# Altium schematic symbol library TI Logic Gate.SchLib: 2017 symbols (part 8 of 36) (continued)
## CD4081BPWR (continued)
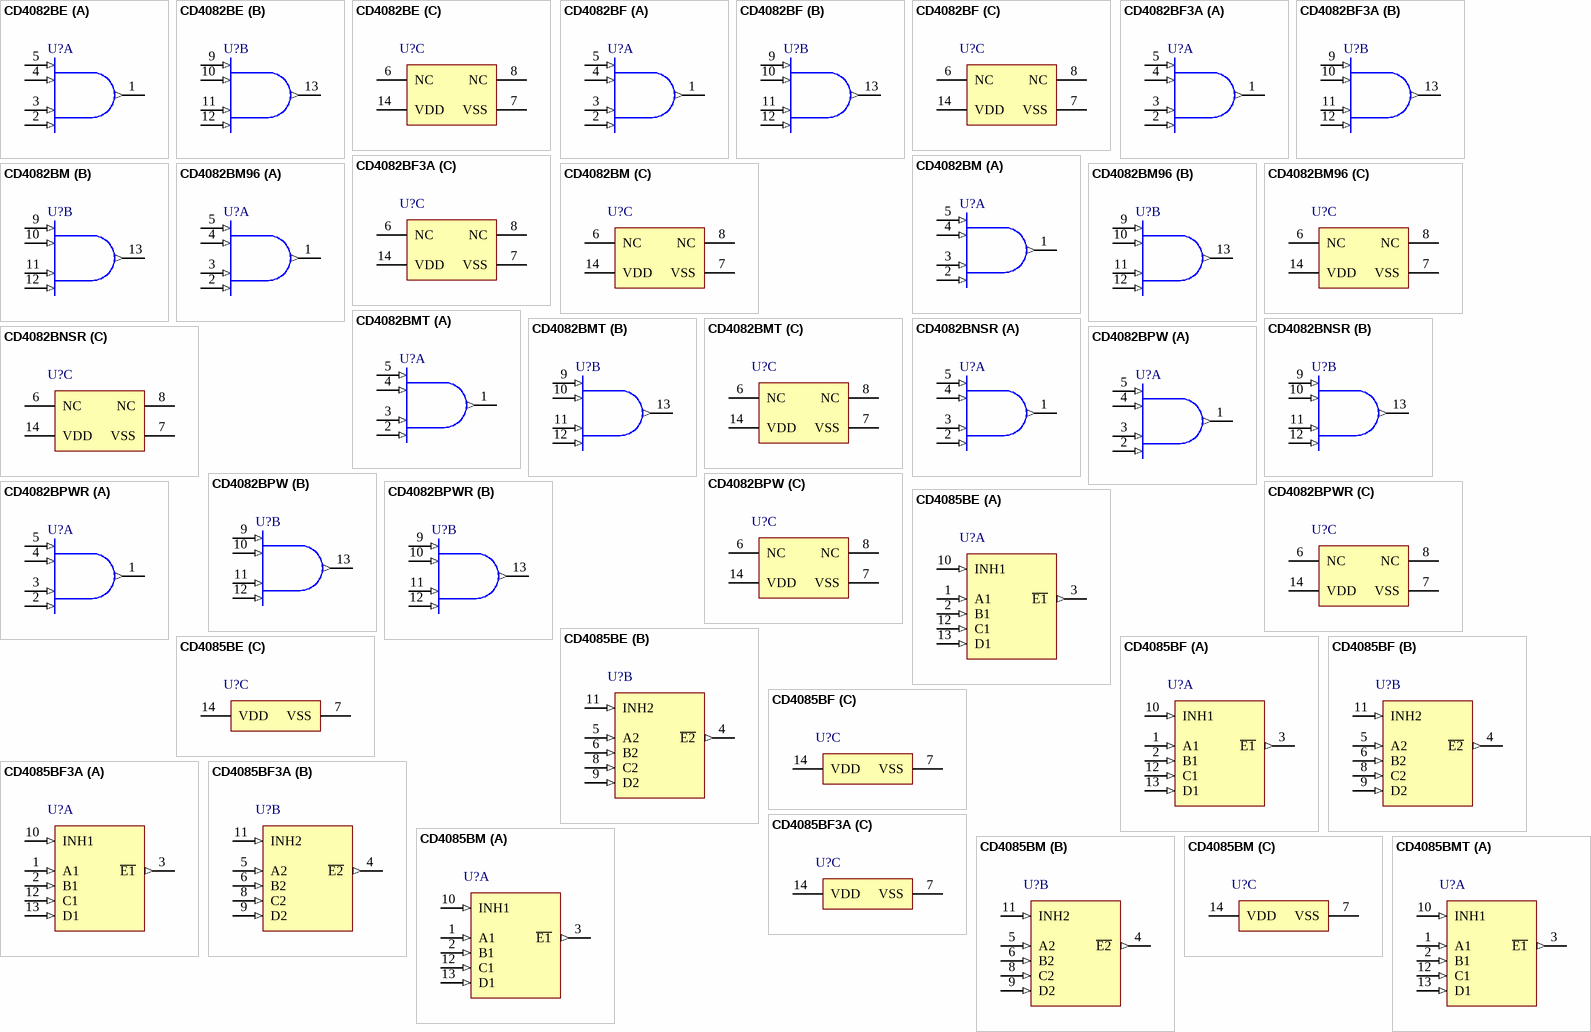
[diagram p47: symbols CD4082BE to CD4085BMT]

## CD4082BE
designator U?
CMOS Dual 4-Input AND Gate, N0014A, TUBE; Generic Part Number: CD4082B; Manufacturer: Texas Instruments; PartNumber: CD4082BE; VCC(Max)(V): 18; VCC(Min)(V): 3; ICC @ Nom Voltage(Max)(mA): 0.015; Bits(#): 2; F @ Nom Voltage(Max)(Mhz): 8; Rating: Catalog; Technology Family: CD4000; Voltage(Nom)(V): 10; Schmitt Trigger: No; Output Drive (IOL/IOH)(Max)(mA): -6.8/6.8; tpd @ Nom Voltage(Max)(ns): 120; DatasheetVersion: SCHS057C; PackageReference: N0014A; Supplier 1: Mouser; Supplier Part Number 1: 595-CD4082BE; Supplier 2: Digi-Key; Supplier Part Number 2: 296-2067-5-ND; Output Type: CMOS; Input Type: CMOS; Operating Temperature Range(C): -55 to 125; ComponentLink1Description: Manufacturer URL; ComponentLink1URL: http://www.ti.com/; ComponentLink2Description: Datasheet; ComponentLink2URL: http://www.ti.com/lit/ds/symlink/cd4082b.pdf
footprint N0014A (DIP, 14-Leads, Body 19.7x6.6mm, Pitch 2.54mm)
part A pins: 1 J (out), 2 D (in), 3 C (in), 4 B (in), 5 A (in)
part B pins: 9 E (in), 10 F (in), 11 G (in), 12 H (in), 13 K (out)
part C pins: 6 NC, 7 VSS (power), 8 NC, 14 VDD (power)

## CD4082BF
designator U?
CMOS Dual 4-Input AND Gate, J0014A, TUBE; Generic Part Number: CD4082B-MIL; Manufacturer: Texas Instruments; PartNumber: CD4082BF; VCC(Max)(V): 18; VCC(Min)(V): 3; ICC @ Nom Voltage(Max)(mA): 0.015; Bits(#): 2; F @ Nom Voltage(Max)(Mhz): 8; Rating: Military; Technology Family: CD4000; Voltage(Nom)(V): 10; Schmitt Trigger: No; Output Drive (IOL/IOH)(Max)(mA): -1.5/1.5; tpd @ Nom Voltage(Max)(ns): 250; DatasheetVersion: SCHS057C; PackageReference: J0014A; Output Type: CMOS; Input Type: CMOS; Operating Temperature Range(C): -55 to 125; ComponentLink1Description: Manufacturer URL; ComponentLink1URL: http://www.ti.com/; ComponentLink2Description: Datasheet; ComponentLink2URL: http://www.ti.com/lit/ds/symlink/cd4082b-mil.pdf
footprint J0014A (DIP, 14-Leads, Body 19.95x7.2mm, Pitch 2.54mm)
part A pins: 1 J (out), 2 D (in), 3 C (in), 4 B (in), 5 A (in)
part B pins: 9 E (in), 10 F (in), 11 G (in), 12 H (in), 13 K (out)
part C pins: 6 NC, 7 VSS (power), 8 NC, 14 VDD (power)

## CD4082BF3A
designator U?
CMOS Dual 4-Input AND Gate, J0014A, TUBE; Generic Part Number: CD4082B-MIL; Manufacturer: Texas Instruments; PartNumber: CD4082BF3A; VCC(Max)(V): 18; VCC(Min)(V): 3; ICC @ Nom Voltage(Max)(mA): 0.015; Bits(#): 2; F @ Nom Voltage(Max)(Mhz): 8; Rating: Military; Technology Family: CD4000; Voltage(Nom)(V): 10; Schmitt Trigger: No; Output Drive (IOL/IOH)(Max)(mA): -1.5/1.5; tpd @ Nom Voltage(Max)(ns): 250; DatasheetVersion: SCHS057C; PackageReference: J0014A; Output Type: CMOS; Input Type: CMOS; Operating Temperature Range(C): -55 to 125; ComponentLink1Description: Manufacturer URL; ComponentLink1URL: http://www.ti.com/; ComponentLink2Description: Datasheet; ComponentLink2URL: http://www.ti.com/lit/ds/symlink/cd4082b-mil.pdf
footprint J0014A (DIP, 14-Leads, Body 19.95x7.2mm, Pitch 2.54mm)
part A pins: 1 J (out), 2 D (in), 3 C (in), 4 B (in), 5 A (in)
part B pins: 9 E (in), 10 F (in), 11 G (in), 12 H (in), 13 K (out)
part C pins: 6 NC, 7 VSS (power), 8 NC, 14 VDD (power)

## CD4082BM
designator U?
CMOS Dual 4-Input AND Gate, D0014A, TUBE; Generic Part Number: CD4082B; Manufacturer: Texas Instruments; PartNumber: CD4082BM; VCC(Max)(V): 18; VCC(Min)(V): 3; ICC @ Nom Voltage(Max)(mA): 0.015; Bits(#): 2; F @ Nom Voltage(Max)(Mhz): 8; Rating: Catalog; Technology Family: CD4000; Voltage(Nom)(V): 10; Schmitt Trigger: No; Output Drive (IOL/IOH)(Max)(mA): -6.8/6.8; tpd @ Nom Voltage(Max)(ns): 120; DatasheetVersion: SCHS057C; PackageReference: D0014A; Supplier 1: Mouser; Supplier Part Number 1: 595-CD4082BM; Supplier 2: Digi-Key; Supplier Part Number 2: 296-32913-5-ND; Output Type: CMOS; Input Type: CMOS; Operating Temperature Range(C): -55 to 125; ComponentLink1Description: Manufacturer URL; ComponentLink1URL: http://www.ti.com/; ComponentLink2Description: Datasheet; ComponentLink2URL: http://www.ti.com/lit/ds/symlink/cd4082b.pdf
footprint D0014A_N (SOIC, 14-Leads, Body 8.75x4mm, Pitch 1.27mm, IPC Medium Density)
footprint D0014A_M (SOIC, 14-Leads, Body 8.75x4mm, Pitch 1.27mm, IPC Low Density)
footprint D0014A_L (SOIC, 14-Leads, Body 8.75x4mm, Pitch 1.27mm, IPC High Density)
part A pins: 1 J (out), 2 D (in), 3 C (in), 4 B (in), 5 A (in)
part B pins: 9 E (in), 10 F (in), 11 G (in), 12 H (in), 13 K (out)
part C pins: 6 NC, 7 VSS (power), 8 NC, 14 VDD (power)

## CD4082BM96
designator U?
CMOS Dual 4-Input AND Gate, D0014A, LARGE T&R; Generic Part Number: CD4082B; Manufacturer: Texas Instruments; PartNumber: CD4082BM96; VCC(Max)(V): 18; VCC(Min)(V): 3; ICC @ Nom Voltage(Max)(mA): 0.015; Bits(#): 2; F @ Nom Voltage(Max)(Mhz): 8; Rating: Catalog; Technology Family: CD4000; Voltage(Nom)(V): 10; Schmitt Trigger: No; Output Drive (IOL/IOH)(Max)(mA): -6.8/6.8; tpd @ Nom Voltage(Max)(ns): 120; DatasheetVersion: SCHS057C; PackageReference: D0014A; Supplier 1: Mouser; Supplier Part Number 1: 595-CD4082BM96; Supplier 2: Digi-Key; Supplier Part Number 2: 296-31523-2-ND; Supplier 3: Digi-Key; Supplier Part Number 3: 296-31523-1-ND; Supplier 4: Digi-Key; Supplier Part Number 4: 296-31523-6-ND; Output Type: CMOS; Input Type: CMOS; Operating Temperature Range(C): -55 to 125; ComponentLink1Description: Manufacturer URL; ComponentLink1URL: http://www.ti.com/; ComponentLink2Description: Datasheet; ComponentLink2URL: http://www.ti.com/lit/ds/symlink/cd4082b.pdf
footprint D0014A_N (SOIC, 14-Leads, Body 8.75x4mm, Pitch 1.27mm, IPC Medium Density)
footprint D0014A_M (SOIC, 14-Leads, Body 8.75x4mm, Pitch 1.27mm, IPC Low Density)
footprint D0014A_L (SOIC, 14-Leads, Body 8.75x4mm, Pitch 1.27mm, IPC High Density)
part A pins: 1 J (out), 2 D (in), 3 C (in), 4 B (in), 5 A (in)
part B pins: 9 E (in), 10 F (in), 11 G (in), 12 H (in), 13 K (out)
part C pins: 6 NC, 7 VSS (power), 8 NC, 14 VDD (power)

## CD4082BMT
designator U?
CMOS Dual 4-Input AND Gate, D0014A, SMALL T&R; Generic Part Number: CD4082B; Manufacturer: Texas Instruments; PartNumber: CD4082BMT; VCC(Max)(V): 18; VCC(Min)(V): 3; ICC @ Nom Voltage(Max)(mA): 0.015; Bits(#): 2; F @ Nom Voltage(Max)(Mhz): 8; Rating: Catalog; Technology Family: CD4000; Voltage(Nom)(V): 10; Schmitt Trigger: No; Output Drive (IOL/IOH)(Max)(mA): -6.8/6.8; tpd @ Nom Voltage(Max)(ns): 120; DatasheetVersion: SCHS057C; PackageReference: D0014A; Supplier 1: Mouser; Supplier Part Number 1: 595-CD4082BMT; Supplier 2: Digi-Key; Supplier Part Number 2: CD4082BMT-ND; Output Type: CMOS; Input Type: CMOS; Operating Temperature Range(C): -55 to 125; ComponentLink1Description: Manufacturer URL; ComponentLink1URL: http://www.ti.com/; ComponentLink2Description: Datasheet; ComponentLink2URL: http://www.ti.com/lit/ds/symlink/cd4082b.pdf
footprint D0014A_N (SOIC, 14-Leads, Body 8.75x4mm, Pitch 1.27mm, IPC Medium Density)
footprint D0014A_M (SOIC, 14-Leads, Body 8.75x4mm, Pitch 1.27mm, IPC Low Density)
footprint D0014A_L (SOIC, 14-Leads, Body 8.75x4mm, Pitch 1.27mm, IPC High Density)
part A pins: 1 J (out), 2 D (in), 3 C (in), 4 B (in), 5 A (in)
part B pins: 9 E (in), 10 F (in), 11 G (in), 12 H (in), 13 K (out)
part C pins: 6 NC, 7 VSS (power), 8 NC, 14 VDD (power)

## CD4082BNSR
designator U?
CMOS Dual 4-Input AND Gate, NS0014A, LARGE T&R; Generic Part Number: CD4082B; Manufacturer: Texas Instruments; PartNumber: CD4082BNSR; VCC(Max)(V): 18; VCC(Min)(V): 3; ICC @ Nom Voltage(Max)(mA): 0.015; Bits(#): 2; F @ Nom Voltage(Max)(Mhz): 8; Rating: Catalog; Technology Family: CD4000; Voltage(Nom)(V): 10; Schmitt Trigger: No; Output Drive (IOL/IOH)(Max)(mA): -6.8/6.8; tpd @ Nom Voltage(Max)(ns): 120; DatasheetVersion: SCHS057C; PackageReference: NS0014A; Supplier 1: Mouser; Supplier Part Number 1: 595-CD4082BNSR; Supplier 2: Digi-Key; Supplier Part Number 2: 296-31524-2-ND; Supplier 3: Digi-Key; Supplier Part Number 3: 296-31524-1-ND; Supplier 4: Digi-Key; Supplier Part Number 4: 296-31524-6-ND; Output Type: CMOS; Input Type: CMOS; Operating Temperature Range(C): -55 to 125; ComponentLink1Description: Manufacturer URL; ComponentLink1URL: http://www.ti.com/; ComponentLink2Description: Datasheet; ComponentLink2URL: http://www.ti.com/lit/ds/symlink/cd4082b.pdf
footprint NS0014A_N (SOIC,14-Leads,Body 10.5x5.6mm,Pitch 1.27mm,IPC Medium Density)
footprint NS0014A_M (SOIC,14-Leads,Body 10.5x5.6mm,Pitch 1.27mm,IPC Low Density)
footprint NS0014A_L (SOIC,14-Leads,Body 10.5x5.6mm,Pitch 0.4mm,IPC High Density)
part A pins: 1 J (out), 2 D (in), 3 C (in), 4 B (in), 5 A (in)
part B pins: 9 E (in), 10 F (in), 11 G (in), 12 H (in), 13 K (out)
part C pins: 6 NC, 7 VSS (power), 8 NC, 14 VDD (power)

## CD4082BPW
designator U?
CMOS Dual 4-Input AND Gate, PW0014A, TUBE; Generic Part Number: CD4082B; Manufacturer: Texas Instruments; PartNumber: CD4082BPW; VCC(Max)(V): 18; VCC(Min)(V): 3; ICC @ Nom Voltage(Max)(mA): 0.015; Bits(#): 2; F @ Nom Voltage(Max)(Mhz): 8; Rating: Catalog; Technology Family: CD4000; Voltage(Nom)(V): 10; Schmitt Trigger: No; Output Drive (IOL/IOH)(Max)(mA): -6.8/6.8; tpd @ Nom Voltage(Max)(ns): 120; DatasheetVersion: SCHS057C; PackageReference: PW0014A; Supplier 1: Mouser; Supplier Part Number 1: 595-CD4082BPW; Supplier 2: Digi-Key; Supplier Part Number 2: 296-32914-5-ND; Output Type: CMOS; Input Type: CMOS; Operating Temperature Range(C): -55 to 125; ComponentLink1Description: Manufacturer URL; ComponentLink1URL: http://www.ti.com/; ComponentLink2Description: Datasheet; ComponentLink2URL: http://www.ti.com/lit/ds/symlink/cd4082b.pdf
footprint PW0014A_N (SOP, 14-Leads, Body 5.1x4.5mm, Pitch 0.65mm, IPC Medium Density)
footprint PW0014A_M (SOP, 14-Leads, Body 5.1x4.5mm, Pitch 0.65mm, IPC Low Density)
footprint PW0014A_L (SOP, 14-Leads, Body 5.1x4.5mm, Pitch 0.65mm, IPC High Density)
part A pins: 1 J (out), 2 D (in), 3 C (in), 4 B (in), 5 A (in)
part B pins: 9 E (in), 10 F (in), 11 G (in), 12 H (in), 13 K (out)
part C pins: 6 NC, 7 VSS (power), 8 NC, 14 VDD (power)

## CD4082BPWR
designator U?
CMOS Dual 4-Input AND Gate, PW0014A, LARGE T&R; Generic Part Number: CD4082B; Manufacturer: Texas Instruments; PartNumber: CD4082BPWR; VCC(Max)(V): 18; VCC(Min)(V): 3; ICC @ Nom Voltage(Max)(mA): 0.015; Bits(#): 2; F @ Nom Voltage(Max)(Mhz): 8; Rating: Catalog; Technology Family: CD4000; Voltage(Nom)(V): 10; Schmitt Trigger: No; Output Drive (IOL/IOH)(Max)(mA): -6.8/6.8; tpd @ Nom Voltage(Max)(ns): 120; DatasheetVersion: SCHS057C; PackageReference: PW0014A; Supplier 1: Mouser; Supplier Part Number 1: 595-CD4082BPWR; Supplier 2: Digi-Key; Supplier Part Number 2: 296-31525-2-ND; Supplier 3: Digi-Key; Supplier Part Number 3: 296-31525-1-ND; Supplier 4: Digi-Key; Supplier Part Number 4: 296-31525-6-ND; Output Type: CMOS; Input Type: CMOS; Operating Temperature Range(C): -55 to 125; ComponentLink1Description: Manufacturer URL; ComponentLink1URL: http://www.ti.com/; ComponentLink2Description: Datasheet; ComponentLink2URL: http://www.ti.com/lit/ds/symlink/cd4082b.pdf
footprint PW0014A_N (SOP, 14-Leads, Body 5.1x4.5mm, Pitch 0.65mm, IPC Medium Density)
footprint PW0014A_M (SOP, 14-Leads, Body 5.1x4.5mm, Pitch 0.65mm, IPC Low Density)
footprint PW0014A_L (SOP, 14-Leads, Body 5.1x4.5mm, Pitch 0.65mm, IPC High Density)
part A pins: 1 J (out), 2 D (in), 3 C (in), 4 B (in), 5 A (in)
part B pins: 9 E (in), 10 F (in), 11 G (in), 12 H (in), 13 K (out)
part C pins: 6 NC, 7 VSS (power), 8 NC, 14 VDD (power)

## CD4085BE
designator U?
CMOS Dual 2-Wide 2-Input AND-OR-INVERT Gate, N0014A, TUBE; Generic Part Number: CD4085B; Manufacturer: Texas Instruments; PartNumber: CD4085BE; VCC(Max)(V): 18; VCC(Min)(V): 3; ICC @ Nom Voltage(Max)(mA): 0.06; Bits(#): 2; F @ Nom Voltage(Max)(Mhz): 8; Rating: Catalog; Technology Family: CD4000; Voltage(Nom)(V): 10; Schmitt Trigger: No; Output Drive (IOL/IOH)(Max)(mA): 1.5/-1.5; tpd @ Nom Voltage(Max)(ns): 250; DatasheetVersion: SCHS060C; PackageReference: N0014A; Supplier 1: Mouser; Supplier Part Number 1: 595-CD4085BE; Supplier 2: Digi-Key; Supplier Part Number 2: 296-3522-5-ND; Output Type: CMOS; Input Type: CMOS; Operating Temperature Range(C): -55 to 125; Code_JEDEC: MS-001; ComponentLink1Description: Manufacturer URL; ComponentLink1URL: http://www.ti.com/; ComponentLink2Description: Datasheet; ComponentLink2URL: http://www.ti.com/lit/ds/symlink/cd4085b.pdf; ComponentLink3Description: Package Specification; ComponentLink3URL: http://www.ti.com/lit/ml/mpdi002c/mpdi002c.pdf
footprint N0014A (DIP, 14-Leads, Body 19.7x6.6mm, Pitch 2.54mm)
part A pins: 1 A1 (in), 2 B1 (in), 3 ~{E1} (out), 10 INH1 (in), 12 C1 (in), 13 D1 (in)
part B pins: 4 ~{E2} (out), 5 A2 (in), 6 B2 (in), 8 C2 (in), 9 D2 (in), 11 INH2 (in)
part C pins: 7 VSS (power), 14 VDD (power)

## CD4085BF
designator U?
CMOS Dual 2-Wide 2-Input AND-OR-INVERT Gate, J0014A, TUBE; Generic Part Number: CD4085B-MIL; Manufacturer: Texas Instruments; PartNumber: CD4085BF; VCC(Max)(V): 18; VCC(Min)(V): 3; ICC @ Nom Voltage(Max)(mA): 0.06; Bits(#): 2; F @ Nom Voltage(Max)(Mhz): 8; Rating: Military; Technology Family: CD4000; Voltage(Nom)(V): 10; Schmitt Trigger: No; Output Drive (IOL/IOH)(Max)(mA): 1.5/-1.5; tpd @ Nom Voltage(Max)(ns): 250; DatasheetVersion: SCHS060C; PackageReference: J0014A; Output Type: CMOS; Input Type: CMOS; Operating Temperature Range(C): -55 to 125; ComponentLink1Description: Manufacturer URL; ComponentLink1URL: http://www.ti.com/; ComponentLink2Description: Datasheet; ComponentLink2URL: http://www.ti.com/lit/ds/symlink/cd4085b-mil.pdf; ComponentLink3Description: Package Specification; ComponentLink3URL: http://www.ti.com/lit/ml/mcer002d/mcer002d.pdf
footprint J0014A (DIP, 14-Leads, Body 19.95x7.2mm, Pitch 2.54mm)
part A pins: 1 A1 (in), 2 B1 (in), 3 ~{E1} (out), 10 INH1 (in), 12 C1 (in), 13 D1 (in)
part B pins: 4 ~{E2} (out), 5 A2 (in), 6 B2 (in), 8 C2 (in), 9 D2 (in), 11 INH2 (in)
part C pins: 7 VSS (power), 14 VDD (power)

## CD4085BF3A
designator U?
CMOS Dual 2-Wide 2-Input AND-OR-INVERT Gate, J0014A, TUBE; Generic Part Number: CD4085B-MIL; Manufacturer: Texas Instruments; PartNumber: CD4085BF3A; VCC(Max)(V): 18; VCC(Min)(V): 3; ICC @ Nom Voltage(Max)(mA): 0.06; Bits(#): 2; F @ Nom Voltage(Max)(Mhz): 8; Rating: Military; Technology Family: CD4000; Voltage(Nom)(V): 10; Schmitt Trigger: No; Output Drive (IOL/IOH)(Max)(mA): 1.5/-1.5; tpd @ Nom Voltage(Max)(ns): 250; DatasheetVersion: SCHS060C; PackageReference: J0014A; Output Type: CMOS; Input Type: CMOS; Operating Temperature Range(C): -55 to 125; ComponentLink1Description: Manufacturer URL; ComponentLink1URL: http://www.ti.com/; ComponentLink2Description: Datasheet; ComponentLink2URL: http://www.ti.com/lit/ds/symlink/cd4085b-mil.pdf; ComponentLink3Description: Package Specification; ComponentLink3URL: http://www.ti.com/lit/ml/mcer002d/mcer002d.pdf
footprint J0014A (DIP, 14-Leads, Body 19.95x7.2mm, Pitch 2.54mm)
part A pins: 1 A1 (in), 2 B1 (in), 3 ~{E1} (out), 10 INH1 (in), 12 C1 (in), 13 D1 (in)
part B pins: 4 ~{E2} (out), 5 A2 (in), 6 B2 (in), 8 C2 (in), 9 D2 (in), 11 INH2 (in)
part C pins: 7 VSS (power), 14 VDD (power)

## CD4085BM
designator U?
CMOS Dual 2-Wide 2-Input AND-OR-INVERT Gate, D0014A, TUBE; Generic Part Number: CD4085B; Manufacturer: Texas Instruments; PartNumber: CD4085BM; VCC(Max)(V): 18; VCC(Min)(V): 3; ICC @ Nom Voltage(Max)(mA): 0.06; Bits(#): 2; F @ Nom Voltage(Max)(Mhz): 8; Rating: Catalog; Technology Family: CD4000; Voltage(Nom)(V): 10; Schmitt Trigger: No; Output Drive (IOL/IOH)(Max)(mA): 1.5/-1.5; tpd @ Nom Voltage(Max)(ns): 250; DatasheetVersion: SCHS060C; PackageReference: D0014A; Supplier 1: Mouser; Supplier Part Number 1: 595-CD4085BM; Supplier 2: Digi-Key; Supplier Part Number 2: 296-32915-5-ND; Output Type: CMOS; Input Type: CMOS; Operating Temperature Range(C): -55 to 125; Code_JEDEC: MS-012; ComponentLink1Description: Manufacturer URL; ComponentLink1URL: http://www.ti.com/; ComponentLink2Description: Datasheet; ComponentLink2URL: http://www.ti.com/lit/ds/symlink/cd4085b.pdf; ComponentLink3Description: Package Specification; ComponentLink3URL: http://www.ti.com/lit/ml/mpds177g/mpds177g.pdf
footprint D0014A_N (SOIC, 14-Leads, Body 8.75x4mm, Pitch 1.27mm, IPC Medium Density)
footprint D0014A_M (SOIC, 14-Leads, Body 8.75x4mm, Pitch 1.27mm, IPC Low Density)
footprint D0014A_L (SOIC, 14-Leads, Body 8.75x4mm, Pitch 1.27mm, IPC High Density)
part A pins: 1 A1 (in), 2 B1 (in), 3 ~{E1} (out), 10 INH1 (in), 12 C1 (in), 13 D1 (in)
part B pins: 4 ~{E2} (out), 5 A2 (in), 6 B2 (in), 8 C2 (in), 9 D2 (in), 11 INH2 (in)
part C pins: 7 VSS (power), 14 VDD (power)

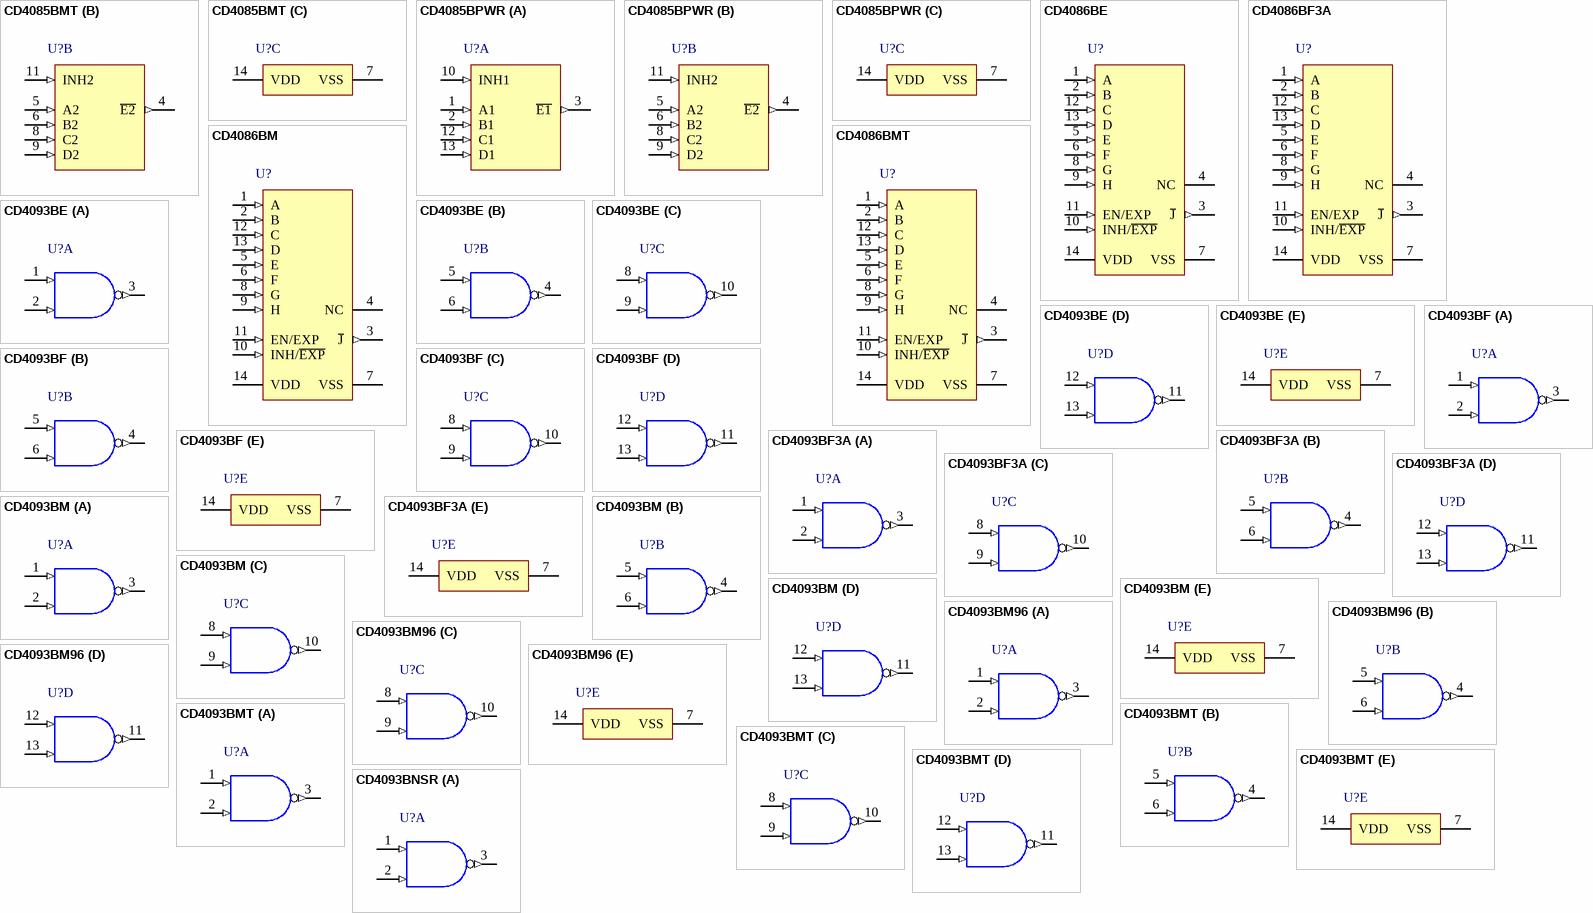
[diagram p48: symbols CD4085BMT to CD4093BNSR]

## CD4085BMT
designator U?
CMOS Dual 2-Wide 2-Input AND-OR-INVERT Gate, D0014A, SMALL T&R; Generic Part Number: CD4085B; Manufacturer: Texas Instruments; PartNumber: CD4085BMT; VCC(Max)(V): 18; VCC(Min)(V): 3; ICC @ Nom Voltage(Max)(mA): 0.06; Bits(#): 2; F @ Nom Voltage(Max)(Mhz): 8; Rating: Catalog; Technology Family: CD4000; Voltage(Nom)(V): 10; Schmitt Trigger: No; Output Drive (IOL/IOH)(Max)(mA): 1.5/-1.5; tpd @ Nom Voltage(Max)(ns): 250; DatasheetVersion: SCHS060C; PackageReference: D0014A; Supplier 1: Mouser; Supplier Part Number 1: 595-CD4085BMT; Supplier 2: Digi-Key; Supplier Part Number 2: CD4085BMT-ND; Output Type: CMOS; Input Type: CMOS; Operating Temperature Range(C): -55 to 125; Code_JEDEC: MS-012; ComponentLink1Description: Manufacturer URL; ComponentLink1URL: http://www.ti.com/; ComponentLink2Description: Datasheet; ComponentLink2URL: http://www.ti.com/lit/ds/symlink/cd4085b.pdf; ComponentLink3Description: Package Specification; ComponentLink3URL: http://www.ti.com/lit/ml/mpds177g/mpds177g.pdf
footprint D0014A_N (SOIC, 14-Leads, Body 8.75x4mm, Pitch 1.27mm, IPC Medium Density)
footprint D0014A_M (SOIC, 14-Leads, Body 8.75x4mm, Pitch 1.27mm, IPC Low Density)
footprint D0014A_L (SOIC, 14-Leads, Body 8.75x4mm, Pitch 1.27mm, IPC High Density)
part A pins: 1 A1 (in), 2 B1 (in), 3 ~{E1} (out), 10 INH1 (in), 12 C1 (in), 13 D1 (in)
part B pins: 4 ~{E2} (out), 5 A2 (in), 6 B2 (in), 8 C2 (in), 9 D2 (in), 11 INH2 (in)
part C pins: 7 VSS (power), 14 VDD (power)

## CD4085BPWR
designator U?
CMOS Dual 2-Wide 2-Input AND-OR-INVERT Gate, PW0014A, LARGE T&R; Generic Part Number: CD4085B; Manufacturer: Texas Instruments; PartNumber: CD4085BPWR; VCC(Max)(V): 18; VCC(Min)(V): 3; ICC @ Nom Voltage(Max)(mA): 0.06; Bits(#): 2; F @ Nom Voltage(Max)(Mhz): 8; Rating: Catalog; Technology Family: CD4000; Voltage(Nom)(V): 10; Schmitt Trigger: No; Output Drive (IOL/IOH)(Max)(mA): 1.5/-1.5; tpd @ Nom Voltage(Max)(ns): 250; DatasheetVersion: SCHS060C; PackageReference: PW0014A; Supplier 1: Mouser; Supplier Part Number 1: 595-CD4085BPWR; Supplier 2: Digi-Key; Supplier Part Number 2: 296-14143-2-ND; Supplier 3: Digi-Key; Supplier Part Number 3: 296-14143-1-ND; Supplier 4: Digi-Key; Supplier Part Number 4: 296-14143-6-ND; Output Type: CMOS; Input Type: CMOS; Operating Temperature Range(C): -55 to 125; Code_JEDEC: MO-153; ComponentLink1Description: Manufacturer URL; ComponentLink1URL: http://www.ti.com/; ComponentLink2Description: Datasheet; ComponentLink2URL: http://www.ti.com/lit/ds/symlink/cd4085b.pdf; ComponentLink3Description: Package Specification; ComponentLink3URL: http://www.ti.com/lit/ml/mpds360/mpds360.pdf
footprint PW0014A_N (SOP, 14-Leads, Body 5.1x4.5mm, Pitch 0.65mm, IPC Medium Density)
footprint PW0014A_M (SOP, 14-Leads, Body 5.1x4.5mm, Pitch 0.65mm, IPC Low Density)
footprint PW0014A_L (SOP, 14-Leads, Body 5.1x4.5mm, Pitch 0.65mm, IPC High Density)
part A pins: 1 A1 (in), 2 B1 (in), 3 ~{E1} (out), 10 INH1 (in), 12 C1 (in), 13 D1 (in)
part B pins: 4 ~{E2} (out), 5 A2 (in), 6 B2 (in), 8 C2 (in), 9 D2 (in), 11 INH2 (in)
part C pins: 7 VSS (power), 14 VDD (power)

## CD4086BE
designator U?